# Altium footprint library PCB-Connectors-2.54mm-排针排母.PCBLIB: 183 footprints (part 11 of 12)
Each footprint in its own frame and in the unit in brackets; x right, y up, seen from the top. Pads: shape width x height; smd on the part's side, far side on the other; paste and mask are expansions set on the pad; w line width, h text height; cw(c..) or ccw(c..) is an arc to the next point about the centre after c.
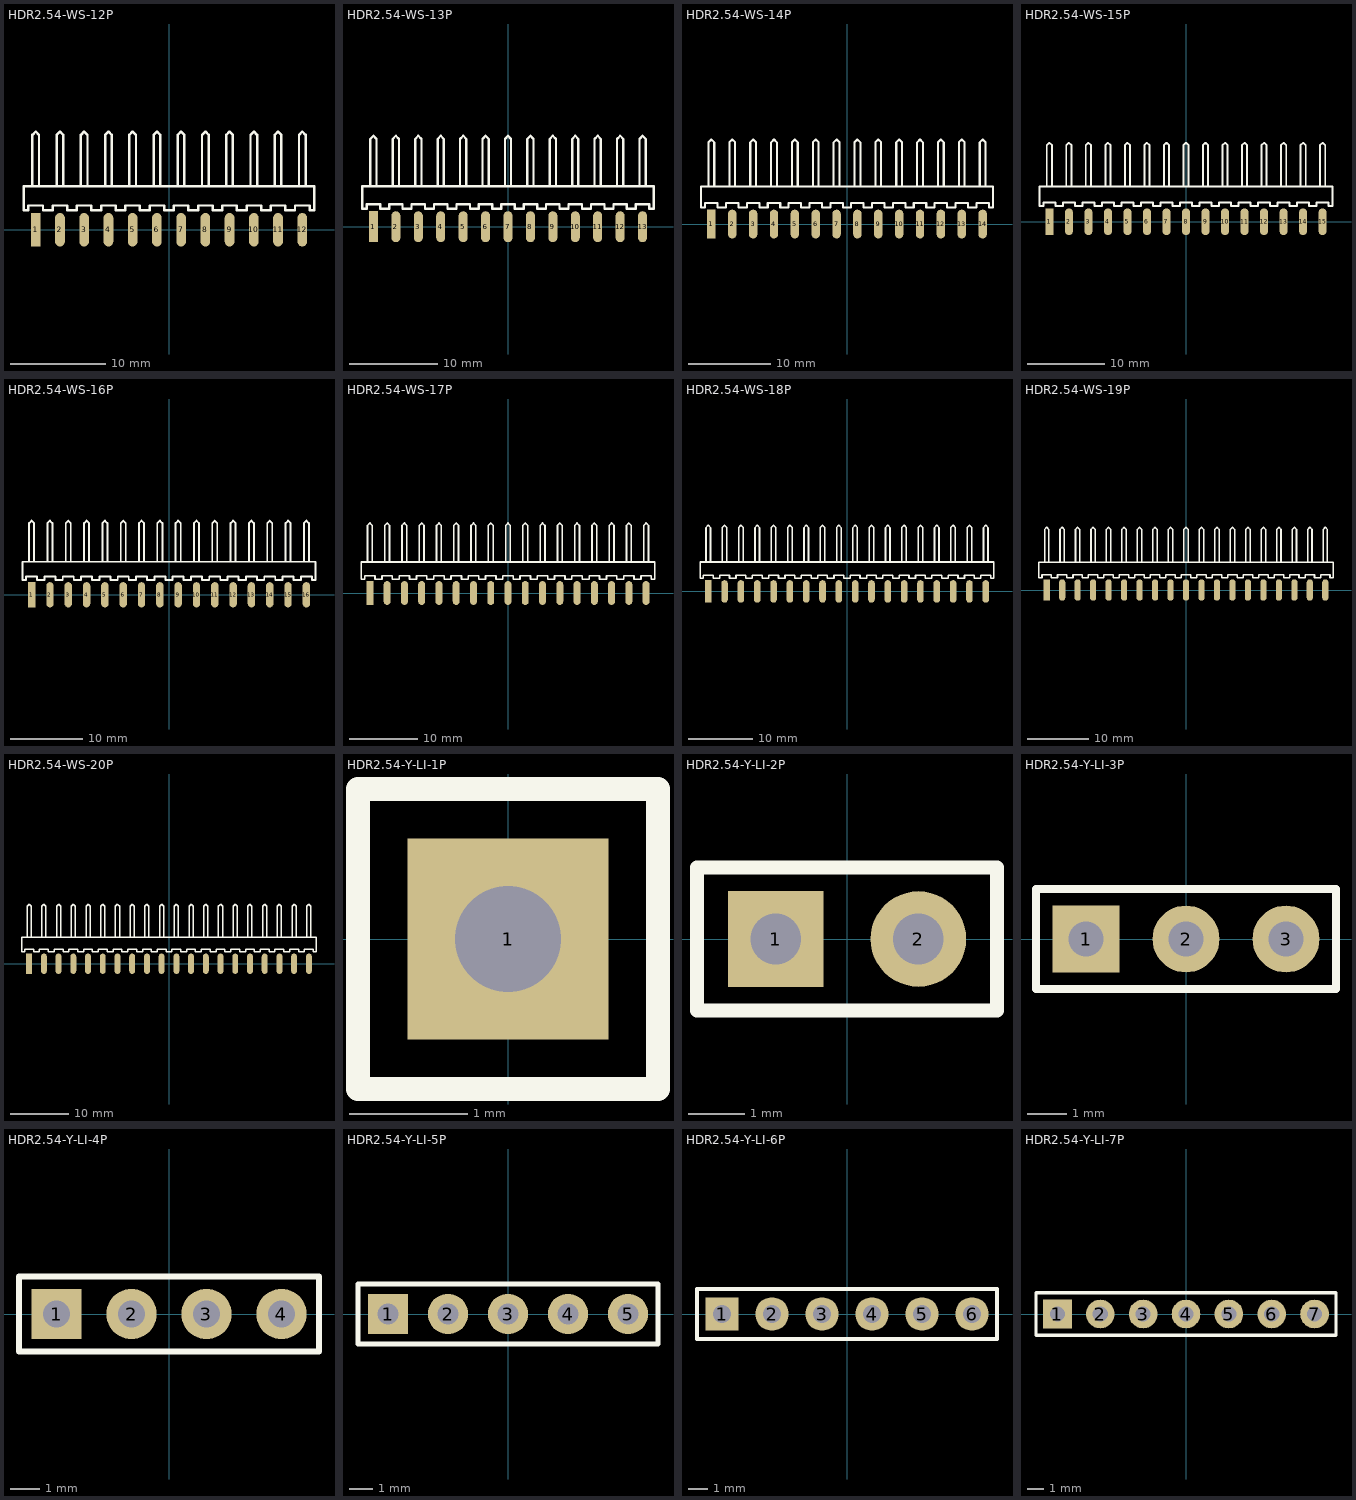
[diagram p10: the footprints below, top view; thin cyan lines are the x and y axes]

## HDR2.54-WS-12P [mm] "12P卧式贴片排针2.54"
pads (12):
  rect 1.02x3.5 smd: 1(-13.97,0)
  oval 1.02x3.5 smd: 2(-11.43,0) 3(-8.89,0) 4(-6.35,0) 5(-3.81,0) 6(-1.27,0) 7(1.27,0) 8(3.81,0) 9(6.35,0) 10(8.89,0) 11(11.43,0) 12(13.97,0)
Top Overlay:
  drawing of 158 lines, arcs and shapes, not listed
3D body "HDR2.54 S-W-1P.STEP": height 2.59, standoff 0.05, extent -12.7,-0.762 -10.16,10.338
3D body "HDR2.54 S-W-1P.STEP": height 2.59, standoff 0.05, extent -15.24,-0.762 -12.7,10.338
3D body "HDR2.54 S-W-1P.STEP": height 2.59, standoff 0.05, extent -7.62,-0.762 -5.08,10.338
3D body "HDR2.54 S-W-1P.STEP": height 2.59, standoff 0.05, extent -10.16,-0.762 -7.62,10.338
3D body "HDR2.54 S-W-1P.STEP": height 2.59, standoff 0.05, extent -2.54,-0.762 0,10.338
3D body "HDR2.54 S-W-1P.STEP": height 2.59, standoff 0.05, extent -5.08,-0.762 -2.54,10.338
3D body "HDR2.54 S-W-1P.STEP": height 2.59, standoff 0.05, extent 2.54,-0.762 5.08,10.338
3D body "HDR2.54 S-W-1P.STEP": height 2.59, standoff 0.05, extent 0,-0.762 2.54,10.338
3D body "HDR2.54 S-W-1P.STEP": height 2.59, standoff 0.05, extent 7.62,-0.762 10.16,10.338
3D body "HDR2.54 S-W-1P.STEP": height 2.59, standoff 0.05, extent 5.08,-0.762 7.62,10.338
3D body "HDR2.54 S-W-1P.STEP": height 2.59, standoff 0.05, extent 12.7,-0.762 15.24,10.338
3D body "HDR2.54 S-W-1P.STEP": height 2.59, standoff 0.05, extent 10.16,-0.762 12.7,10.338

## HDR2.54-WS-13P [mm] "13P卧式贴片排针2.54"
pads (13):
  rect 1.02x3.5 smd: 1(-15.24,0)
  oval 1.02x3.5 smd: 2(-12.7,0) 3(-10.16,0) 4(-7.62,0) 5(-5.08,0) 6(-2.54,0) 7(0,0) 8(2.54,0) 9(5.08,0) 10(7.62,0) 11(10.16,0) 12(12.7,0) 13(15.24,0)
Top Overlay:
  drawing of 171 lines, arcs and shapes, not listed
3D body "HDR2.54 S-W-1P.STEP": height 2.59, standoff 0.05, extent -13.97,-0.762 -11.43,10.338
3D body "HDR2.54 S-W-1P.STEP": height 2.59, standoff 0.05, extent -16.51,-0.762 -13.97,10.338
3D body "HDR2.54 S-W-1P.STEP": height 2.59, standoff 0.05, extent -8.89,-0.762 -6.35,10.338
3D body "HDR2.54 S-W-1P.STEP": height 2.59, standoff 0.05, extent -11.43,-0.762 -8.89,10.338
3D body "HDR2.54 S-W-1P.STEP": height 2.59, standoff 0.05, extent -3.81,-0.762 -1.27,10.338
3D body "HDR2.54 S-W-1P.STEP": height 2.59, standoff 0.05, extent -6.35,-0.762 -3.81,10.338
3D body "HDR2.54 S-W-1P.STEP": height 2.59, standoff 0.05, extent 1.27,-0.762 3.81,10.338
3D body "HDR2.54 S-W-1P.STEP": height 2.59, standoff 0.05, extent -1.27,-0.762 1.27,10.338
3D body "HDR2.54 S-W-1P.STEP": height 2.59, standoff 0.05, extent 6.35,-0.762 8.89,10.338
3D body "HDR2.54 S-W-1P.STEP": height 2.59, standoff 0.05, extent 3.81,-0.762 6.35,10.338
3D body "HDR2.54 S-W-1P.STEP": height 2.59, standoff 0.05, extent 11.43,-0.762 13.97,10.338
3D body "HDR2.54 S-W-1P.STEP": height 2.59, standoff 0.05, extent 8.89,-0.762 11.43,10.338
3D body "HDR2.54 S-W-1P.STEP": height 2.59, standoff 0.05, extent 13.97,-0.762 16.51,10.338

## HDR2.54-WS-14P [mm] "14P卧式贴片排针2.54"
pads (14):
  rect 1.02x3.5 smd: 1(-16.51,0)
  oval 1.02x3.5 smd: 2(-13.97,0) 3(-11.43,0) 4(-8.89,0) 5(-6.35,0) 6(-3.81,0) 7(-1.27,0) 8(1.27,0) 9(3.81,0) 10(6.35,0) 11(8.89,0) 12(11.43,0) 13(13.97,0) 14(16.51,0)
Top Overlay:
  drawing of 184 lines, arcs and shapes, not listed
3D body "HDR2.54 S-W-1P.STEP": height 2.59, standoff 0.05, extent -15.24,-0.762 -12.7,10.338
3D body "HDR2.54 S-W-1P.STEP": height 2.59, standoff 0.05, extent -17.78,-0.762 -15.24,10.338
3D body "HDR2.54 S-W-1P.STEP": height 2.59, standoff 0.05, extent -10.16,-0.762 -7.62,10.338
3D body "HDR2.54 S-W-1P.STEP": height 2.59, standoff 0.05, extent -12.7,-0.762 -10.16,10.338
3D body "HDR2.54 S-W-1P.STEP": height 2.59, standoff 0.05, extent -5.08,-0.762 -2.54,10.338
3D body "HDR2.54 S-W-1P.STEP": height 2.59, standoff 0.05, extent -7.62,-0.762 -5.08,10.338
3D body "HDR2.54 S-W-1P.STEP": height 2.59, standoff 0.05, extent 0,-0.762 2.54,10.338
3D body "HDR2.54 S-W-1P.STEP": height 2.59, standoff 0.05, extent -2.54,-0.762 0,10.338
3D body "HDR2.54 S-W-1P.STEP": height 2.59, standoff 0.05, extent 5.08,-0.762 7.62,10.338
3D body "HDR2.54 S-W-1P.STEP": height 2.59, standoff 0.05, extent 2.54,-0.762 5.08,10.338
3D body "HDR2.54 S-W-1P.STEP": height 2.59, standoff 0.05, extent 10.16,-0.762 12.7,10.338
3D body "HDR2.54 S-W-1P.STEP": height 2.59, standoff 0.05, extent 7.62,-0.762 10.16,10.338
3D body "HDR2.54 S-W-1P.STEP": height 2.59, standoff 0.05, extent 15.24,-0.762 17.78,10.338
3D body "HDR2.54 S-W-1P.STEP": height 2.59, standoff 0.05, extent 12.7,-0.762 15.24,10.338

## HDR2.54-WS-15P [mm] "15P卧式贴片排针2.54"
pads (15):
  rect 1.02x3.5 smd: 1(-17.78,0)
  oval 1.02x3.5 smd: 2(-15.24,0) 3(-12.7,0) 4(-10.16,0) 5(-7.62,0) 6(-5.08,0) 7(-2.54,0) 8(0,0) 9(2.54,0) 10(5.08,0) 11(7.62,0) 12(10.16,0) 13(12.7,0) 14(15.24,0) 15(17.78,0)
Top Overlay:
  drawing of 197 lines, arcs and shapes, not listed
3D body "HDR2.54 S-W-1P.STEP": height 2.59, standoff 0.05, extent -16.51,-0.762 -13.97,10.338
3D body "HDR2.54 S-W-1P.STEP": height 2.59, standoff 0.05, extent -19.05,-0.762 -16.51,10.338
3D body "HDR2.54 S-W-1P.STEP": height 2.59, standoff 0.05, extent -11.43,-0.762 -8.89,10.338
3D body "HDR2.54 S-W-1P.STEP": height 2.59, standoff 0.05, extent -13.97,-0.762 -11.43,10.338
3D body "HDR2.54 S-W-1P.STEP": height 2.59, standoff 0.05, extent -6.35,-0.762 -3.81,10.338
3D body "HDR2.54 S-W-1P.STEP": height 2.59, standoff 0.05, extent -8.89,-0.762 -6.35,10.338
3D body "HDR2.54 S-W-1P.STEP": height 2.59, standoff 0.05, extent -1.27,-0.762 1.27,10.338
3D body "HDR2.54 S-W-1P.STEP": height 2.59, standoff 0.05, extent -3.81,-0.762 -1.27,10.338
3D body "HDR2.54 S-W-1P.STEP": height 2.59, standoff 0.05, extent 3.81,-0.762 6.35,10.338
3D body "HDR2.54 S-W-1P.STEP": height 2.59, standoff 0.05, extent 1.27,-0.762 3.81,10.338
3D body "HDR2.54 S-W-1P.STEP": height 2.59, standoff 0.05, extent 8.89,-0.762 11.43,10.338
3D body "HDR2.54 S-W-1P.STEP": height 2.59, standoff 0.05, extent 6.35,-0.762 8.89,10.338
3D body "HDR2.54 S-W-1P.STEP": height 2.59, standoff 0.05, extent 13.97,-0.762 16.51,10.338
3D body "HDR2.54 S-W-1P.STEP": height 2.59, standoff 0.05, extent 11.43,-0.762 13.97,10.338
3D body "HDR2.54 S-W-1P.STEP": height 2.59, standoff 0.05, extent 16.51,-0.762 19.05,10.338

## HDR2.54-WS-16P [mm] "16P卧式贴片排针2.54                        联系卖家 免费查找封装"
pads (16):
  rect 1.02x3.5 smd: 1(-19.05,0)
  oval 1.02x3.5 smd: 2(-16.51,0) 3(-13.97,0) 4(-11.43,0) 5(-8.89,0) 6(-6.35,0) 7(-3.81,0) 8(-1.27,0) 9(1.27,0) 10(3.81,0) 11(6.35,0) 12(8.89,0) 13(11.43,0) 14(13.97,0) 15(16.51,0) 16(19.05,0)
Top Overlay:
  drawing of 210 lines, arcs and shapes, not listed
3D body "HDR2.54 S-W-1P.STEP": height 2.59, standoff 0.05, extent -17.78,-0.762 -15.24,10.338
3D body "HDR2.54 S-W-1P.STEP": height 2.59, standoff 0.05, extent -20.32,-0.762 -17.78,10.338
3D body "HDR2.54 S-W-1P.STEP": height 2.59, standoff 0.05, extent -12.7,-0.762 -10.16,10.338
3D body "HDR2.54 S-W-1P.STEP": height 2.59, standoff 0.05, extent -15.24,-0.762 -12.7,10.338
3D body "HDR2.54 S-W-1P.STEP": height 2.59, standoff 0.05, extent -7.62,-0.762 -5.08,10.338
3D body "HDR2.54 S-W-1P.STEP": height 2.59, standoff 0.05, extent -10.16,-0.762 -7.62,10.338
3D body "HDR2.54 S-W-1P.STEP": height 2.59, standoff 0.05, extent -2.54,-0.762 0,10.338
3D body "HDR2.54 S-W-1P.STEP": height 2.59, standoff 0.05, extent -5.08,-0.762 -2.54,10.338
3D body "HDR2.54 S-W-1P.STEP": height 2.59, standoff 0.05, extent 2.54,-0.762 5.08,10.338
3D body "HDR2.54 S-W-1P.STEP": height 2.59, standoff 0.05, extent 0,-0.762 2.54,10.338
3D body "HDR2.54 S-W-1P.STEP": height 2.59, standoff 0.05, extent 7.62,-0.762 10.16,10.338
3D body "HDR2.54 S-W-1P.STEP": height 2.59, standoff 0.05, extent 5.08,-0.762 7.62,10.338
3D body "HDR2.54 S-W-1P.STEP": height 2.59, standoff 0.05, extent 12.7,-0.762 15.24,10.338
3D body "HDR2.54 S-W-1P.STEP": height 2.59, standoff 0.05, extent 10.16,-0.762 12.7,10.338
3D body "HDR2.54 S-W-1P.STEP": height 2.59, standoff 0.05, extent 17.78,-0.762 20.32,10.338
3D body "HDR2.54 S-W-1P.STEP": height 2.59, standoff 0.05, extent 15.24,-0.762 17.78,10.338

## HDR2.54-WS-17P [mm] "17P卧式贴片排针2.54"
pads (17):
  rect 1.02x3.5 smd: 1(-20.32,0)
  oval 1.02x3.5 smd: 2(-17.78,0) 3(-15.24,0) 4(-12.7,0) 5(-10.16,0) 6(-7.62,0) 7(-5.08,0) 8(-2.54,0) 9(0,0) 10(2.54,0) 11(5.08,0) 12(7.62,0) 13(10.16,0) 14(12.7,0) 15(15.24,0) 16(17.78,0) 17(20.32,0)
Top Overlay:
  drawing of 223 lines, arcs and shapes, not listed
3D body "HDR2.54 S-W-1P.STEP": height 2.59, standoff 0.05, extent 19.05,-0.762 21.59,10.338
3D body "HDR2.54 S-W-1P.STEP": height 2.59, standoff 0.05, extent 13.97,-0.762 16.51,10.338
3D body "HDR2.54 S-W-1P.STEP": height 2.59, standoff 0.05, extent 16.51,-0.762 19.05,10.338
3D body "HDR2.54 S-W-1P.STEP": height 2.59, standoff 0.05, extent 8.89,-0.762 11.43,10.338
3D body "HDR2.54 S-W-1P.STEP": height 2.59, standoff 0.05, extent 11.43,-0.762 13.97,10.338
3D body "HDR2.54 S-W-1P.STEP": height 2.59, standoff 0.05, extent 3.81,-0.762 6.35,10.338
3D body "HDR2.54 S-W-1P.STEP": height 2.59, standoff 0.05, extent 6.35,-0.762 8.89,10.338
3D body "HDR2.54 S-W-1P.STEP": height 2.59, standoff 0.05, extent -1.27,-0.762 1.27,10.338
3D body "HDR2.54 S-W-1P.STEP": height 2.59, standoff 0.05, extent 1.27,-0.762 3.81,10.338
3D body "HDR2.54 S-W-1P.STEP": height 2.59, standoff 0.05, extent -6.35,-0.762 -3.81,10.338
3D body "HDR2.54 S-W-1P.STEP": height 2.59, standoff 0.05, extent -3.81,-0.762 -1.27,10.338
3D body "HDR2.54 S-W-1P.STEP": height 2.59, standoff 0.05, extent -11.43,-0.762 -8.89,10.338
3D body "HDR2.54 S-W-1P.STEP": height 2.59, standoff 0.05, extent -8.89,-0.762 -6.35,10.338
3D body "HDR2.54 S-W-1P.STEP": height 2.59, standoff 0.05, extent -16.51,-0.762 -13.97,10.338
3D body "HDR2.54 S-W-1P.STEP": height 2.59, standoff 0.05, extent -13.97,-0.762 -11.43,10.338
3D body "HDR2.54 S-W-1P.STEP": height 2.59, standoff 0.05, extent -21.59,-0.762 -19.05,10.338
3D body "HDR2.54 S-W-1P.STEP": height 2.59, standoff 0.05, extent -19.05,-0.762 -16.51,10.338

## HDR2.54-WS-18P [mm] "18P卧式贴片排针2.54"
pads (18):
  rect 1.02x3.5 smd: 1(-21.59,0)
  oval 1.02x3.5 smd: 2(-19.05,0) 3(-16.51,0) 4(-13.97,0) 5(-11.43,0) 6(-8.89,0) 7(-6.35,0) 8(-3.81,0) 9(-1.27,0) 10(1.27,0) 11(3.81,0) 12(6.35,0) 13(8.89,0) 14(11.43,0) 15(13.97,0) 16(16.51,0) 17(19.05,0) 18(21.59,0)
Top Overlay:
  drawing of 236 lines, arcs and shapes, not listed
3D body "HDR2.54 S-W-1P.STEP": height 2.59, standoff 0.05, extent 17.78,-0.762 20.32,10.338
3D body "HDR2.54 S-W-1P.STEP": height 2.59, standoff 0.05, extent 20.32,-0.762 22.86,10.338
3D body "HDR2.54 S-W-1P.STEP": height 2.59, standoff 0.05, extent 12.7,-0.762 15.24,10.338
3D body "HDR2.54 S-W-1P.STEP": height 2.59, standoff 0.05, extent 15.24,-0.762 17.78,10.338
3D body "HDR2.54 S-W-1P.STEP": height 2.59, standoff 0.05, extent 7.62,-0.762 10.16,10.338
3D body "HDR2.54 S-W-1P.STEP": height 2.59, standoff 0.05, extent 10.16,-0.762 12.7,10.338
3D body "HDR2.54 S-W-1P.STEP": height 2.59, standoff 0.05, extent 2.54,-0.762 5.08,10.338
3D body "HDR2.54 S-W-1P.STEP": height 2.59, standoff 0.05, extent 5.08,-0.762 7.62,10.338
3D body "HDR2.54 S-W-1P.STEP": height 2.59, standoff 0.05, extent -2.54,-0.762 0,10.338
3D body "HDR2.54 S-W-1P.STEP": height 2.59, standoff 0.05, extent 0,-0.762 2.54,10.338
3D body "HDR2.54 S-W-1P.STEP": height 2.59, standoff 0.05, extent -7.62,-0.762 -5.08,10.338
3D body "HDR2.54 S-W-1P.STEP": height 2.59, standoff 0.05, extent -5.08,-0.762 -2.54,10.338
3D body "HDR2.54 S-W-1P.STEP": height 2.59, standoff 0.05, extent -12.7,-0.762 -10.16,10.338
3D body "HDR2.54 S-W-1P.STEP": height 2.59, standoff 0.05, extent -10.16,-0.762 -7.62,10.338
3D body "HDR2.54 S-W-1P.STEP": height 2.59, standoff 0.05, extent -17.78,-0.762 -15.24,10.338
3D body "HDR2.54 S-W-1P.STEP": height 2.59, standoff 0.05, extent -15.24,-0.762 -12.7,10.338
3D body "HDR2.54 S-W-1P.STEP": height 2.59, standoff 0.05, extent -22.86,-0.762 -20.32,10.338
3D body "HDR2.54 S-W-1P.STEP": height 2.59, standoff 0.05, extent -20.32,-0.762 -17.78,10.338

## HDR2.54-WS-19P [mm] "19P卧式贴片排针2.54"
pads (19):
  rect 1.02x3.5 smd: 1(-22.86,0)
  oval 1.02x3.5 smd: 2(-20.32,0) 3(-17.78,0) 4(-15.24,0) 5(-12.7,0) 6(-10.16,0) 7(-7.62,0) 8(-5.08,0) 9(-2.54,0) 10(0,0) 11(2.54,0) 12(5.08,0) 13(7.62,0) 14(10.16,0) 15(12.7,0) 16(15.24,0) 17(17.78,0) 18(20.32,0) 19(22.86,0)
Top Overlay:
  drawing of 249 lines, arcs and shapes, not listed
3D body "HDR2.54 S-W-1P.STEP": height 2.59, standoff 0.05, extent 21.59,-0.762 24.13,10.338
3D body "HDR2.54 S-W-1P.STEP": height 2.59, standoff 0.05, extent 16.51,-0.762 19.05,10.338
3D body "HDR2.54 S-W-1P.STEP": height 2.59, standoff 0.05, extent 19.05,-0.762 21.59,10.338
3D body "HDR2.54 S-W-1P.STEP": height 2.59, standoff 0.05, extent 11.43,-0.762 13.97,10.338
3D body "HDR2.54 S-W-1P.STEP": height 2.59, standoff 0.05, extent 13.97,-0.762 16.51,10.338
3D body "HDR2.54 S-W-1P.STEP": height 2.59, standoff 0.05, extent 6.35,-0.762 8.89,10.338
3D body "HDR2.54 S-W-1P.STEP": height 2.59, standoff 0.05, extent 8.89,-0.762 11.43,10.338
3D body "HDR2.54 S-W-1P.STEP": height 2.59, standoff 0.05, extent 1.27,-0.762 3.81,10.338
3D body "HDR2.54 S-W-1P.STEP": height 2.59, standoff 0.05, extent 3.81,-0.762 6.35,10.338
3D body "HDR2.54 S-W-1P.STEP": height 2.59, standoff 0.05, extent -3.81,-0.762 -1.27,10.338
3D body "HDR2.54 S-W-1P.STEP": height 2.59, standoff 0.05, extent -1.27,-0.762 1.27,10.338
3D body "HDR2.54 S-W-1P.STEP": height 2.59, standoff 0.05, extent -8.89,-0.762 -6.35,10.338
3D body "HDR2.54 S-W-1P.STEP": height 2.59, standoff 0.05, extent -6.35,-0.762 -3.81,10.338
3D body "HDR2.54 S-W-1P.STEP": height 2.59, standoff 0.05, extent -13.97,-0.762 -11.43,10.338
3D body "HDR2.54 S-W-1P.STEP": height 2.59, standoff 0.05, extent -11.43,-0.762 -8.89,10.338
3D body "HDR2.54 S-W-1P.STEP": height 2.59, standoff 0.05, extent -19.05,-0.762 -16.51,10.338
3D body "HDR2.54 S-W-1P.STEP": height 2.59, standoff 0.05, extent -16.51,-0.762 -13.97,10.338
3D body "HDR2.54 S-W-1P.STEP": height 2.59, standoff 0.05, extent -24.13,-0.762 -21.59,10.338
3D body "HDR2.54 S-W-1P.STEP": height 2.59, standoff 0.05, extent -21.59,-0.762 -19.05,10.338

## HDR2.54-WS-20P [mm] "20P卧式贴片排针2.54"
pads (20):
  rect 1.02x3.5 smd: 1(-24.13,0)
  oval 1.02x3.5 smd: 2(-21.59,0) 3(-19.05,0) 4(-16.51,0) 5(-13.97,0) 6(-11.43,0) 7(-8.89,0) 8(-6.35,0) 9(-3.81,0) 10(-1.27,0) 11(1.27,0) 12(3.81,0) 13(6.35,0) 14(8.89,0) 15(11.43,0) 16(13.97,0) 17(16.51,0) 18(19.05,0) 19(21.59,0) 20(24.13,0)
Top Overlay:
  drawing of 262 lines, arcs and shapes, not listed
3D body "HDR2.54 S-W-1P.STEP": height 2.59, standoff 0.05, extent 20.32,-0.762 22.86,10.338
3D body "HDR2.54 S-W-1P.STEP": height 2.59, standoff 0.05, extent 22.86,-0.762 25.4,10.338
3D body "HDR2.54 S-W-1P.STEP": height 2.59, standoff 0.05, extent 15.24,-0.762 17.78,10.338
3D body "HDR2.54 S-W-1P.STEP": height 2.59, standoff 0.05, extent 17.78,-0.762 20.32,10.338
3D body "HDR2.54 S-W-1P.STEP": height 2.59, standoff 0.05, extent 10.16,-0.762 12.7,10.338
3D body "HDR2.54 S-W-1P.STEP": height 2.59, standoff 0.05, extent 12.7,-0.762 15.24,10.338
3D body "HDR2.54 S-W-1P.STEP": height 2.59, standoff 0.05, extent 5.08,-0.762 7.62,10.338
3D body "HDR2.54 S-W-1P.STEP": height 2.59, standoff 0.05, extent 7.62,-0.762 10.16,10.338
3D body "HDR2.54 S-W-1P.STEP": height 2.59, standoff 0.05, extent 0,-0.762 2.54,10.338
3D body "HDR2.54 S-W-1P.STEP": height 2.59, standoff 0.05, extent 2.54,-0.762 5.08,10.338
3D body "HDR2.54 S-W-1P.STEP": height 2.59, standoff 0.05, extent -5.08,-0.762 -2.54,10.338
3D body "HDR2.54 S-W-1P.STEP": height 2.59, standoff 0.05, extent -2.54,-0.762 0,10.338
3D body "HDR2.54 S-W-1P.STEP": height 2.59, standoff 0.05, extent -10.16,-0.762 -7.62,10.338
3D body "HDR2.54 S-W-1P.STEP": height 2.59, standoff 0.05, extent -7.62,-0.762 -5.08,10.338
3D body "HDR2.54 S-W-1P.STEP": height 2.59, standoff 0.05, extent -15.24,-0.762 -12.7,10.338
3D body "HDR2.54 S-W-1P.STEP": height 2.59, standoff 0.05, extent -12.7,-0.762 -10.16,10.338
3D body "HDR2.54 S-W-1P.STEP": height 2.59, standoff 0.05, extent -20.32,-0.762 -17.78,10.338
3D body "HDR2.54 S-W-1P.STEP": height 2.59, standoff 0.05, extent -17.78,-0.762 -15.24,10.338
3D body "HDR2.54 S-W-1P.STEP": height 2.59, standoff 0.05, extent -25.4,-0.762 -22.86,10.338
3D body "HDR2.54 S-W-1P.STEP": height 2.59, standoff 0.05, extent -22.86,-0.762 -20.32,10.338

## HDR2.54-Y-LI-1P [mm] "圆孔排母，1脚                        联系卖家 免费查找封装"
pads (1):
  rect 1.7x1.7 hole 0.9: 1(0,0)
Top Overlay:
  lines w0.2: -1.27,-1.27 1.27,-1.27 1.27,1.27 -1.27,1.27 -1.27,-1.27
3D body "HDR-1P_Y.STEP": height 4.31, standoff -3, extent -1.27,-1.27 1.27,1.27

## HDR2.54-Y-LI-2P [mm] "圆孔排母，2脚                        联系卖家 免费查找封装"
pads (2):
  rect 1.7x1.7 hole 0.9: 1(-1.27,0)
  round 1.7 hole 0.9: 2(1.27,0)
Top Overlay:
  lines w0.254: -2.667,-1.27 2.667,-1.27 2.667,1.27 -2.667,1.27 -2.667,-1.27
3D body "HDR-1P_Y.STEP": height 4.31, standoff -3, extent -2.54,-1.27 0,1.27
3D body "HDR-1P_Y.STEP": height 4.31, standoff -3, extent 0,-1.27 2.54,1.27

## HDR2.54-Y-LI-3P [mm] "圆孔排母，3脚"
pads (3):
  rect 1.7x1.7 hole 0.9: 1(-2.54,0)
  round 1.7 hole 0.9: 2(0,0) 3(2.54,0)
Top Overlay:
  lines w0.2: -3.81,-1.27 -3.81,1.27 3.81,1.27 3.81,-1.27 -3.81,-1.27
3D body "HDR-1P_Y.STEP": height 4.31, standoff -3, extent 1.27,-1.27 3.81,1.27
3D body "HDR-1P_Y.STEP": height 4.31, standoff -3, extent -1.27,-1.27 1.27,1.27
3D body "HDR-1P_Y.STEP": height 4.31, standoff -3, extent -3.81,-1.27 -1.27,1.27

## HDR2.54-Y-LI-4P [mm] "圆孔排母，4脚"
pads (4):
  rect 1.7x1.7 hole 0.9: 1(-3.81,0)
  round 1.7 hole 0.9: 2(-1.27,0) 3(1.27,0) 4(3.81,0)
Top Overlay:
  lines w0.2: -5.08,-1.27 -5.08,1.27 5.08,1.27 5.08,-1.27 -5.08,-1.27
3D body "HDR-1P_Y.STEP": height 4.31, standoff -3, extent 2.54,-1.27 5.08,1.27
3D body "HDR-1P_Y.STEP": height 4.31, standoff -3, extent 0,-1.27 2.54,1.27
3D body "HDR-1P_Y.STEP": height 4.31, standoff -3, extent -2.54,-1.27 0,1.27
3D body "HDR-1P_Y.STEP": height 4.31, standoff -3, extent -5.08,-1.27 -2.54,1.27

## HDR2.54-Y-LI-5P [mm] "圆孔排母，5脚"
pads (5):
  rect 1.7x1.7 hole 0.9: 1(-5.08,0)
  round 1.7 hole 0.9: 2(-2.54,0) 3(0,0) 4(2.54,0) 5(5.08,0)
Top Overlay:
  lines w0.2: -6.35,-1.27 -6.35,1.27 6.35,1.27 6.35,-1.27 -6.35,-1.27
3D body "HDR-1P_Y.STEP": height 4.31, standoff -3, extent 3.81,-1.27 6.35,1.27
3D body "HDR-1P_Y.STEP": height 4.31, standoff -3, extent 1.27,-1.27 3.81,1.27
3D body "HDR-1P_Y.STEP": height 4.31, standoff -3, extent -1.27,-1.27 1.27,1.27
3D body "HDR-1P_Y.STEP": height 4.31, standoff -3, extent -3.81,-1.27 -1.27,1.27
3D body "HDR-1P_Y.STEP": height 4.31, standoff -3, extent -6.35,-1.27 -3.81,1.27

## HDR2.54-Y-LI-6P [mm] "圆孔排母，6脚"
pads (6):
  rect 1.7x1.7 hole 0.9: 1(-6.35,0)
  round 1.7 hole 0.9: 2(-3.81,0) 3(-1.27,0) 4(1.27,0) 5(3.81,0) 6(6.35,0)
Top Overlay:
  lines w0.2: -7.62,-1.27 -7.62,1.27 7.62,1.27 7.62,-1.27 -7.62,-1.27
3D body "HDR-1P_Y.STEP": height 4.31, standoff -3, extent 5.08,-1.27 7.62,1.27
3D body "HDR-1P_Y.STEP": height 4.31, standoff -3, extent 2.54,-1.27 5.08,1.27
3D body "HDR-1P_Y.STEP": height 4.31, standoff -3, extent 0,-1.27 2.54,1.27
3D body "HDR-1P_Y.STEP": height 4.31, standoff -3, extent -2.54,-1.27 0,1.27
3D body "HDR-1P_Y.STEP": height 4.31, standoff -3, extent -5.08,-1.27 -2.54,1.27
3D body "HDR-1P_Y.STEP": height 4.31, standoff -3, extent -7.62,-1.27 -5.08,1.27

## HDR2.54-Y-LI-7P [mm] "圆孔排母，7脚"
pads (7):
  rect 1.7x1.7 hole 0.9: 1(-7.62,0)
  round 1.7 hole 0.9: 2(-5.08,0) 3(-2.54,0) 4(0,0) 5(2.54,0) 6(5.08,0) 7(7.62,0)
Top Overlay:
  lines w0.2: -8.89,-1.27 8.89,-1.27 8.89,1.27 -8.89,1.27 -8.89,-1.27
3D body "HDR-1P_Y.STEP": height 4.31, standoff -3, extent -8.89,-1.27 -6.35,1.27
3D body "HDR-1P_Y.STEP": height 4.31, standoff -3, extent -6.35,-1.27 -3.81,1.27
3D body "HDR-1P_Y.STEP": height 4.31, standoff -3, extent -3.81,-1.27 -1.27,1.27
3D body "HDR-1P_Y.STEP": height 4.31, standoff -3, extent -1.27,-1.27 1.27,1.27
3D body "HDR-1P_Y.STEP": height 4.31, standoff -3, extent 1.27,-1.27 3.81,1.27
3D body "HDR-1P_Y.STEP": height 4.31, standoff -3, extent 3.81,-1.27 6.35,1.27
3D body "HDR-1P_Y.STEP": height 4.31, standoff -3, extent 6.35,-1.27 8.89,1.27